# Altium footprint library SBCLib.PcbLib: 120 footprints (part 2 of 8)
Each footprint in its own frame and in the unit in brackets; x right, y up, seen from the top. Pads: shape width x height; smd on the part's side, far side on the other; paste and mask are expansions set on the pad; w line width, h text height; cw(c..) or ccw(c..) is an arc to the next point about the centre after c.
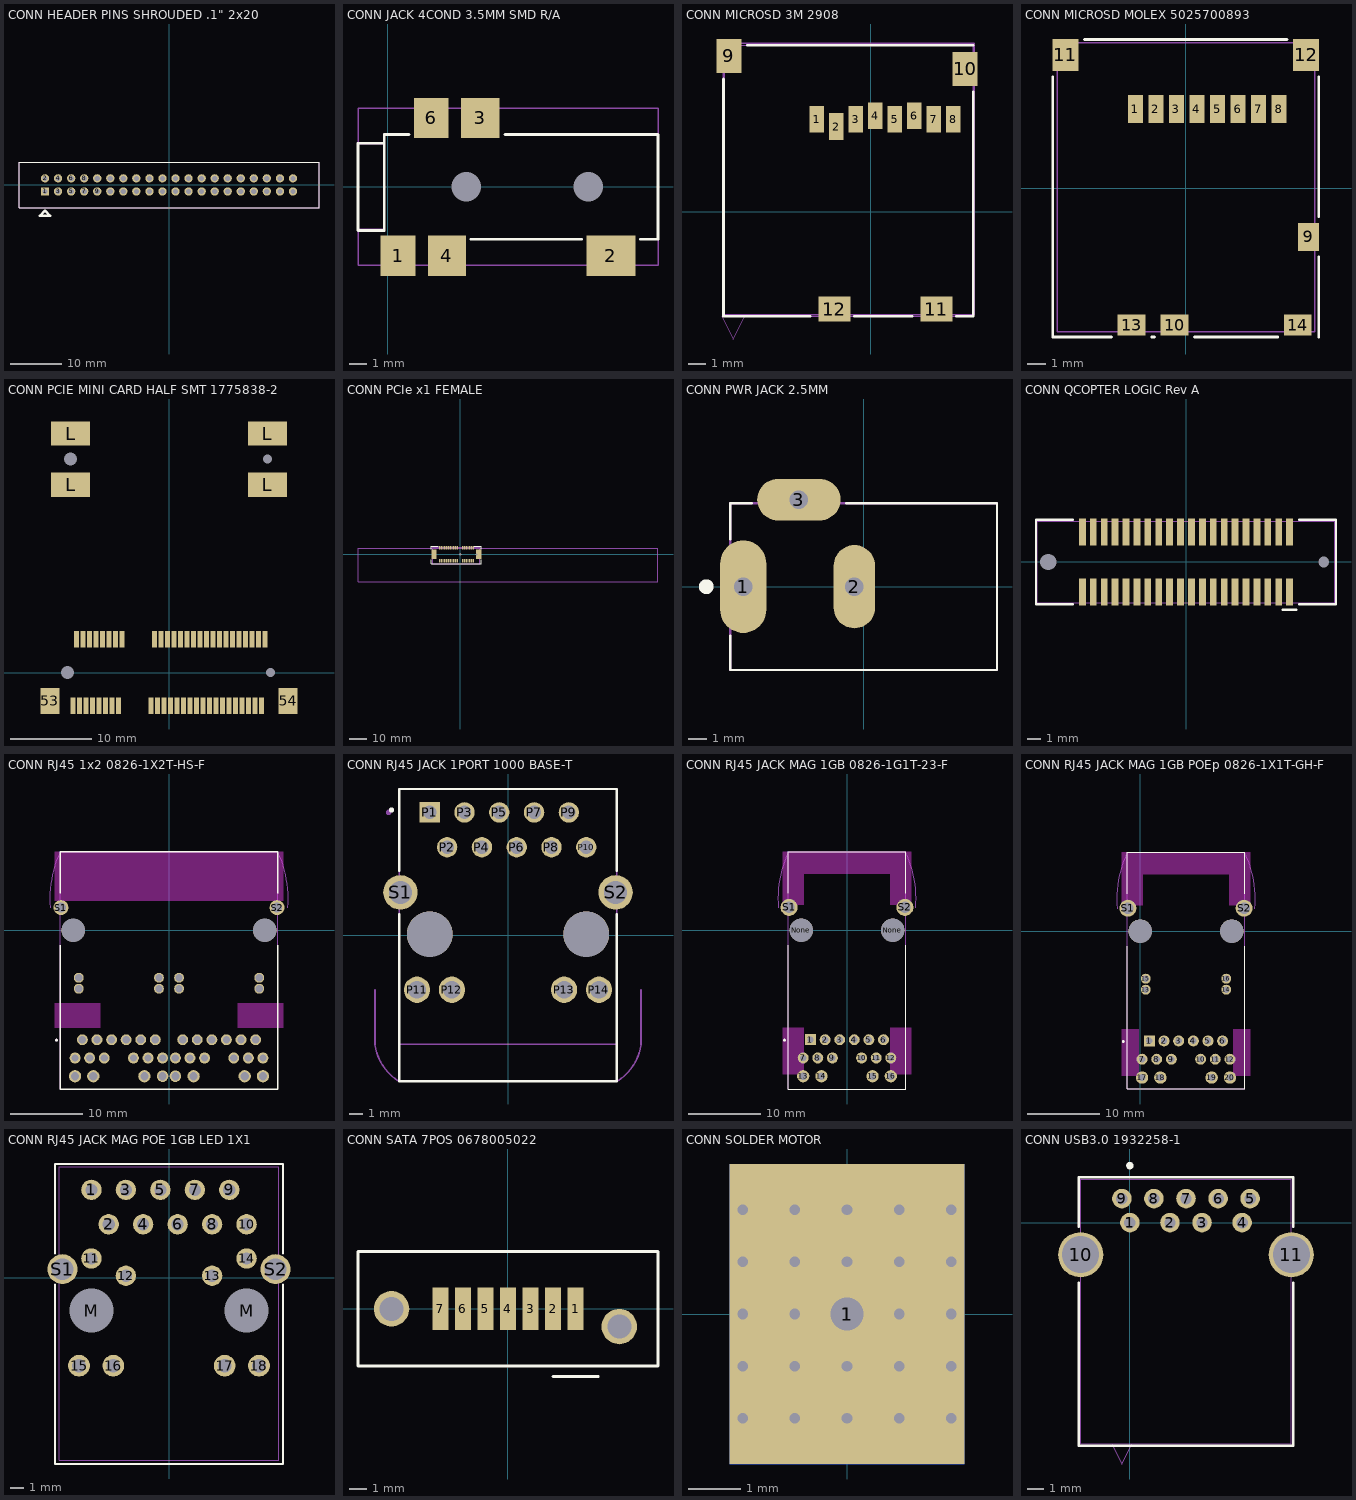
[diagram p1: the footprints below, top view; thin cyan lines are the x and y axes]

## CONN HEADER PINS SHROUDED .1" 2x20 [mm]
pads (40):
  rect 1.52x1.52 hole 1.02 paste+0: 1(-24.13,-1.27)
  round 1.62 hole 1.02 paste+0: 2(-24.13,1.27) 3(-21.59,-1.27) 4(-21.59,1.27) 5(-19.05,-1.27) 6(-19.05,1.27) 7(-16.51,-1.27) 8(-16.51,1.27) 9(-13.97,-1.27) 10(-13.97,1.27) 11(-11.43,-1.27) 12(-11.43,1.27) 13(-8.89,-1.27) 14(-8.89,1.27) 15(-6.35,-1.27) 16(-6.35,1.27) 17(-3.81,-1.27) 18(-3.81,1.27) 19(-1.27,-1.27) 20(-1.27,1.27) 21(1.27,-1.27) 22(1.27,1.27) 23(3.81,-1.27) 24(3.81,1.27) 25(6.35,-1.27) 26(6.35,1.27) 27(8.89,-1.27) 28(8.89,1.27) 29(11.43,-1.27) 30(11.43,1.27) 31(13.97,-1.27) 32(13.97,1.27) 33(16.51,-1.27) 34(16.51,1.27) 35(19.05,-1.27) 36(19.05,1.27) 37(21.59,-1.27) 38(21.59,1.27) 39(24.13,-1.27) 40(24.13,1.27)
Top Overlay:
  lines w0.178: -29.197,-4.407 -29.197,4.407 ; -29.197,-4.407 29.197,-4.407 ; -29.197,-4.407 29.197,-4.407 ; -29.197,-4.407 -29.197,4.407 ; -29.197,4.407 29.197,4.407 ; -29.197,4.407 29.197,4.407 ; 29.197,-4.407 29.197,4.407 ; 29.197,-4.407 29.197,4.407
  lines w0.5: -25.13,-6 -24.13,-5 -23.13,-6 -25.13,-6
Mechanical 3:
  lines w0.152: -29.197,-4.407 -29.197,4.407 ; -29.197,-4.407 29.197,-4.407 ; -29.197,-4.407 29.197,-4.407 ; -29.197,-4.407 -29.197,4.407 ; -29.197,4.407 29.197,4.407 ; -29.197,4.407 29.197,4.407 ; 29.197,-4.407 29.197,4.407 ; 29.197,-4.407 29.197,4.407
3D body "30340-6002.stp": height 8.89, standoff -3.17, extent -29.197,-4.407 29.198,4.407

## CONN JACK 4COND 3.5MM SMD R/A [mm]
pads (7):
  rect 2x2.3 smd paste+0: 1(0.6,-3.95) 6(2.5,3.95)
  rect 2.8x2.3 smd paste+0: 2(12.8,-3.95)
  rect 2.2x2.3 smd paste+0: 3(5.3,3.95) 4(3.4,-3.95)
  rect 1x1 hole 1.7 unplated paste+0: ""(4.5,0) ""(11.5,0)
Top Overlay:
  lines w0.152: -0.2,2.5 -1.7,2.5 -1.7,-2.5 -0.2,-2.5 -0.2,3 1.225,3 ; 4.775,-3 6,-3 11.125,-3 ; 6.725,3 15.5,3 15.5,-3 14.5,-3
Mechanical 3:
  lines w0.076: -1.7,-4.5 -1.7,4.5 15.5,4.5 15.5,-4.5 -1.7,-4.5 ; -1.7,-2.425 -1.7,2.475 -0.2,2.475 -0.2,-2.425 -1.7,-2.425
3D body "CUI_DEVICES_SJ-43515RS-SMT-TR.step": height 5.1, standoff -0.7, extent -1.7,-4.5 15.5,4.5

## CONN MICROSD 3M 2908 [mil]
pads (12):
  rect 32x59 smd: 1(-119.76,203.78) 2(-76.76,187.78) 3(-33.76,203.78) 4(9.24,211.78) 5(52.24,203.78) 6(95.24,211.78) 7(138.24,203.78) 8(181.24,203.78)
  rect 55x75 smd: 9(-313.5,343.5) 10(207.9,315.1)
  rect 71x55 smd: 11(144.5,-215) 12(-80.5,-215)
Top Overlay:
  lines w6: -325.5,292.9 -325.5,-231 -134.1,-231 ; -272.9,367 225.5,367 ; -36.9,-231 90.9,-231 ; 188.1,-231 225.5,-231 225.5,263.9
Mechanical 3:
  lines w3: -323.58,-227.21 -323.58,371.22 227.6,371.22 227.6,-227.21 -323.58,-227.21
Mechanical 13:
  lines w1: -328.94,-231 -303.94,-281 -278.94,-231 ; -325.5,-231 -325.5,367 225.5,367 225.5,-231 -325.5,-231
3D body "2908-05WB-MG--3DModel-STEP-56544.STEP": height 72.83, standoff 0, extent -323.58,-227.21 227.6,371.22

## CONN MICROSD MOLEX 5025700893 [mil]
pads (14):
  rect 32x59 smd paste+0 mask+0: 1(-106.3,167.27) 2(-62.99,167.27) 3(-19.68,167.27) 4(23.62,167.27) 5(66.93,167.27) 6(110.24,167.27) 7(153.54,167.27) 8(196.85,167.27)
  rect 45x59 smd: 9(258.86,-102.42)
  rect 59x45 smd: 10(-23.62,-288.44) 13(-114.17,-288.44) 14(236.22,-288.44)
  rect 55x67 smd: 11(-253.94,281.44) 12(253.94,281.44)
Top Overlay:
  lines w6: -280.5,234.84 -280.5,-314 -156.41,-314 ; -213.34,314 213.34,314 ; -71.94,-314 -65.86,-314 ; 18.62,-314 193.98,-314 ; 280.5,-314 280.5,-145.02 ; 280.5,-59.82 280.5,234.84
Mechanical 3:
  lines w3: -271.66,-303.15 -271.66,307.08 271.65,307.08 271.65,-303.15 -271.66,-303.15
3D body "5025700893.stp": height 70.43, standoff -0.43, extent -271.66,-303.15 271.65,307.08

## CONN PCIE MINI CARD HALF SMT 1775838-2 [mm]
pads (62):
  rect 0.61x2.007 smd paste+0 mask+0: 1(-11.8,-4.1) 2(-11.4,4.1) 3(-11,-4.1) 4(-10.6,4.1) 5(-10.2,-4.1) 6(-9.8,4.1) 7(-9.4,-4.1) 8(-9,4.1) 9(-8.6,-4.1) 10(-8.2,4.1) 11(-7.8,-4.1) 12(-7.4,4.1) 13(-7,-4.1) 14(-6.6,4.1) 15(-6.2,-4.1) 16(-5.8,4.1) 17(-2.2,-4.1) 18(-1.8,4.1) 19(-1.4,-4.1) 20(-1,4.1) 21(-0.6,-4.1) 22(-0.2,4.1) 23(0.2,-4.1) 24(0.6,4.1) 25(1,-4.1) 26(1.4,4.1) 27(1.8,-4.1) 28(2.2,4.1) 29(2.6,-4.1) 30(3,4.1) 31(3.4,-4.1) 32(3.8,4.1) 33(4.2,-4.1) 34(4.6,4.1) 35(5,-4.1) 36(5.4,4.1) 37(5.8,-4.1) 38(6.2,4.1) 39(6.6,-4.1) 40(7,4.1) 41(7.4,-4.1) 42(7.8,4.1) 43(8.2,-4.1) 44(8.6,4.1) 45(9,-4.1) 46(9.4,4.1) 47(9.8,-4.1) 48(10.2,4.1) 49(10.6,-4.1) 50(11,4.1) 51(11.4,-4.1) 52(11.8,4.1)
  rect 2.311x3.2 smd paste+0 mask+0: 53(-14.65,-3.5) 54(14.65,-3.5)
  round 0.5 hole 1.6 unplated: 55(-12.5,0)
  round 0.5 hole 1.118 unplated: 56(12.5,0)
  rect 4.8x3 smd paste+0: L(-12.1,23.1) L(-12.1,29.4) L(12.1,23.1) L(12.1,29.4)
  round 0.5 hole 1.6 unplated paste+0: L(-12.1,26.25)
  round 0.5 hole 1.1 unplated paste+0: L(12.1,26.25)
3D body "User Library-PCI Express Half-Mini Card.step": height 6.45, standoff 1.7, extent -15,0.075 15,26.875
3D body "c-1775838-2-g-3d.stp": height 5.58, standoff -0.67, extent -14.95,-4.58 14.95,4.5
3D body "480995701.stp": height 6.55, standoff -0.75, extent -14.225,21.94 14.225,31.4

## CONN PCIe x1 FEMALE [mm]
pads (40):
  rect 3x5.2 smd: 37(-14.65,0) 38(10.35,0)
  round 1 hole 1.2 unplated: 38(9.15,0) M1(0,0)
  rect 0.7x2 smd: A1(-11.65,3.6) A2(-10.65,3.6) A3(-9.65,3.6) A4(-8.65,3.6) A5(-7.65,3.6) A6(-6.65,3.6) A7(-5.65,3.6) A8(-4.65,3.6) A9(-3.65,3.6) A10(-2.65,3.6) A11(-1.65,3.6) A12(1.35,3.6) A13(2.35,3.6) A14(3.35,3.6) A15(4.35,3.6) A16(5.35,3.6) A17(6.35,3.6) A18(7.35,3.6) B1(-11.65,-3.6) B2(-10.65,-3.6) B3(-9.65,-3.6) B4(-8.65,-3.6) B5(-7.65,-3.6) B6(-6.65,-3.6) B7(-5.65,-3.6) B8(-4.65,-3.6) B9(-3.65,-3.6) B10(-2.65,-3.6) B11(-1.65,-3.6) B12(1.35,-3.6) B13(2.35,-3.6) B14(3.35,-3.6) B15(4.35,-3.6) B16(5.35,-3.6) B17(6.35,-3.6) B18(7.35,-3.6)
Top Overlay:
  lines w0.152: -16.15,-2.875 -16.15,-5.3 11.85,-5.3 11.85,-2.875 ; -16.15,2.875 -16.15,4.6 -12.25,4.6 ; 7.95,4.6 11.85,4.6 11.85,2.875
Mechanical 2:
  lines w0.254: -57.15,-15.34 110.49,-15.34 110.49,3.47 -57.15,3.47 -57.15,-15.34
  text "STD PCIe HALF LENGTH" at 21,-6 h1
Mechanical 3:
  lines w0.076: -15.25,-5.15 -15.25,4.05 10.95,4.05 10.95,-5.15 -15.25,-5.15
3D body "10061913-xx0.stp": height 11.07, standoff -0.93, extent -15.25,-5.15 10.95,4.05

## CONN PWR JACK 2.5MM [mm]
pads (3):
  oval 2.5x5 hole 1 square: 1(-6.5,0)
  oval 2.25x4.5 hole 1 square: 2(-0.5,0)
  oval 4.5x2.25 hole 1 square: 3(-3.5,4.7)
Top Overlay:
  circle w0.4: c-8.5,0 r0.2
  lines w0.127: -7.2,-2.65 -7.2,-4.5 7.2,-4.5 7.2,4.5 -0.95,4.5 ; -7.2,2.55 -7.2,4.5 -6.05,4.5
Mechanical 13:
  lines w0.127: -7.2,-4.5 7.2,-4.5 7.2,4.5 -7.2,4.5 -7.2,-4.5
3D body "CUI_DEVICES_PJ-202BH.step": height 11, standoff -3.5, extent -7.2,-4.5 7.2,4.9

## CONN QCOPTER LOGIC Rev A [mm]
pads (42):
  rect 0.5x2 smd: 1(7.6,-2.2) 2(7.6,2.2) 3(6.8,-2.2) 4(6.8,2.2) 5(6,-2.2) 6(6,2.2) 7(5.2,-2.2) 8(5.2,2.2) 9(4.4,-2.2) 10(4.4,2.2) 11(3.6,-2.2) 12(3.6,2.2) 13(2.8,-2.2) 14(2.8,2.2) 15(2,-2.2) 16(2,2.2) 17(1.2,-2.2) 18(1.2,2.2) 19(0.4,-2.2) 20(0.4,2.2) 21(-0.4,-2.2) 22(-0.4,2.2) 23(-1.2,-2.2) 24(-1.2,2.2) 25(-2,-2.2) 26(-2,2.2) 27(-2.8,-2.2) 28(-2.8,2.2) 29(-3.6,-2.2) 30(-3.6,2.2) 31(-4.4,-2.2) 32(-4.4,2.2) 33(-5.2,-2.2) 34(-5.2,2.2) 35(-6,-2.2) 36(-6,2.2) 37(-6.8,-2.2) 38(-6.8,2.2) 39(-7.6,-2.2) 40(-7.6,2.2)
  round 0.5 hole 1.2 unplated: M1(-10.1,0)
  round 0.5 hole 0.8 unplated: M1(10.1,0)
Top Overlay:
  lines w0.178: -8.3,-3.1 -11,-3.1 -11,3.1 -8.3,3.1 ; 7.1,-3.5 8.1,-3.5 ; 8.3,-3.1 11,-3.1 11,3.1 8.3,3.1
Mechanical 3:
  lines w0.076: -10.9,-3 10.9,-3 10.9,3 -10.9,3 -10.9,-3
3D body "10144518-041x0xxx.stp": height 4.65, standoff -0.7, extent -10.9,-3 10.9,3

## CONN RJ45 1x2 0826-1X2T-HS-F [mil]
pads (44):
  round 60 hole 40: 1_1(75,-600) 1_2(-475,-600) 2_1(155,-600) 2_2(-395,-600) 3_1(235,-600) 3_2(-315,-600) 4_1(315,-600) 4_2(-235,-600) 5_1(395,-600) 5_2(-155,-600) 6_1(475,-600) 6_2(-75,-600) 7_1(35,-700) 7_2(-515,-700) 8_1(115,-700) 8_2(-435,-700) 9_1(195,-700) 9_2(-355,-700) 10_1(355,-700) 10_2(-195,-700) 11_1(435,-700) 11_2(-115,-700) 12_1(515,-700) 12_2(-35,-700)
  round 54 hole 40: 13_1(55,-320) 13_2(-495,-320) 14_1(495,-320) 14_2(-55,-320) 15_1(55,-260) 15_2(-495,-260) 16_1(495,-260) 16_2(-55,-260)
  round 63 hole 45: 17_1(35,-800) 20_2(-35,-800)
  round 67.5 hole 45: 17_2(-515,-800) 18_1(135,-800) 18_2(-415,-800) 19_1(415,-800) 19_2(-135,-800) 20_1(515,-800)
  round 82.5 hole 55: S1(-592.5,125) S2(592.5,125)
  round 128 hole 128 unplated: ""(-525,0) ""(525,0)
Top Overlay:
  circle w7: c-617.52,-602.36 r3.94
  lines w7: -597,-81.81 -597,-870 597,-870 597,-81.81 ; -597,202.99 -597,430 597,430 597,202.99
Keep-Out Layer:
  region: 627,-534 376,-534 376,-399 627,-399
  region: -376,-534 -627,-534 -627,-399 -376,-399
  region: 626,-534 376,-534 376,-399 626,-399
  region: -376,-534 -626,-534 -626,-399 -376,-399
  region: 627,162 -627,162 -627,430 627,430
  region: 627,162 -627,162 -627,430 627,430
Mechanical 13:
  circle w7.87: c-617.52,-602.36 r3.94
  lines w5: -650.96,124.58 cw(c-54.86,176.73) -597.18,429.62 ; 597.18,429.62 cw(c54.86,176.73) 650.96,124.58 ; -597,-870 597,-870 597,430 -597,430 -597,-870
3D body "User Library-RJ45_1x2_8P_1000_mag.STEP": height 616.72, standoff -103.26, extent -635,-867 636.96,452.5

## CONN RJ45 JACK 1PORT 1000 BASE-T [mm] "6-2301994-2"
pads (18):
  rect 1.488x1.488 hole 0.98: P1(-5.715,8.965)
  round 1.488 hole 0.98: P2(-4.445,6.425) P3(-3.175,8.965) P4(-1.905,6.425) P5(-0.635,8.965) P6(0.635,6.425) P7(1.905,8.965) P8(3.175,6.425) P9(4.445,8.965) P10(5.715,6.425)
  round 1.92 hole 1.28: P11(-6.645,-3.985) P12(-4.095,-3.985) P13(4.095,-3.985) P14(6.645,-3.985)
  round 2.52 hole 1.68: S1(-7.855,3.125) S2(7.855,3.125)
  round 3.33 hole 3.33 unplated: ""(-5.715,0.075) ""(5.715,0.075)
Top Overlay:
  circle w0.178: c-8.509,9.144 r0.1
  lines w0.178: -7.95,1.535 -7.95,-10.675 7.95,-10.675 7.95,1.535 ; -7.95,4.705 -7.95,10.675 7.95,10.675 7.95,4.705
Mechanical 3:
  circle w0.2: c-8.715,8.965 r0.1
  lines w0.127: -9.725,-7.968 ccw(c-5.967,-7.44) -7.978,-10.658 ; -9.72,-8 -9.72,-4 ; -7.95,-7.975 7.95,-7.975 ; 7.978,-10.658 ccw(c5.967,-7.44) 9.725,-7.968 ; 9.72,-8 9.72,-4 ; -7.95,-10.675 7.95,-10.675 7.95,10.675 -7.95,10.675 -7.95,-10.675
3D body "c-6-2301994-2-a-3d.stp": height 15.62, standoff -3.68, extent -10,-10.675 10,10.675

## CONN RJ45 JACK MAG 1GB 0826-1G1T-23-F [mil] "0826-1G1T-23-F"
pads (20):
  rect 60x60 hole 35: 1(-200,-600)
  round 60 hole 35: 2(-120,-600) 3(-40,-600) 4(40,-600) 5(120,-600) 6(200,-600) 7(-240,-700) 8(-160,-700) 9(-80,-700) 10(80,-700) 11(160,-700) 12(240,-700)
  round 67.5 hole 40: 13(-240,-800) 14(-140,-800) 15(140,-800) 16(240,-800)
  round 128 hole 128 unplated: None(-250,0) None(250,0)
  round 93 hole 62: S1(-317.5,125) S2(317.5,125)
Top Overlay:
  circle w7.87: c-342.52,-602.36 r3.94
  lines w5: -321,-81.81 -321,-870 321,-870 321,-81.81 ; -321,202.99 -321,430 321,430 321,202.99
Keep-Out Layer:
  region: -351,140 -236,140 -236,310 236,310 236,140 351,140 351,430 -351,430
  region: -351,140 -236,140 -236,310 236,310 236,140 351,140 351,430 -351,430
  region: -351,-535 -236,-535 -236,-790 -351,-790
  region: 236,-535 351,-535 351,-790 236,-790
  region: -351,-535 -236,-535 -236,-790 -351,-790
  region: 236,-535 351,-535 351,-790 236,-790
  region: -351,140 -236,140 -236,310 236,310 236,140 351,140 351,430 -351,430
  region: -351,140 -236,140 -236,310 236,310 236,140 351,140 351,430 -351,430
  region: -351,-535 -236,-535 -236,-790 -351,-790
  region: 236,-535 351,-535 351,-790 236,-790
  region: -351,-535 -236,-535 -236,-790 -351,-790
  region: 236,-535 351,-535 351,-790 236,-790
  region: -351,140 -236,140 -236,310 236,310 236,140 351,140 351,430 -351,430
  region: -351,140 -236,140 -236,310 236,310 236,140 351,140 351,430 -351,430
  region: -351,-535 -236,-535 -236,-790 -351,-790
  region: 236,-535 351,-535 351,-790 236,-790
  region: -351,-535 -236,-535 -236,-790 -351,-790
  region: 236,-535 351,-535 351,-790 236,-790
Mechanical 3:
  circle w7.87: c-342.52,-602.36 r3.94
  circle w7.87: c-342.52,-602.36 r3.94
  lines w5: -321,-870 321,-870 ; -321,-870 321,-870 ; -321,-870 -321,430 ; -321,-870 -321,430 ; -321,430 321,430 ; -321,430 321,430 ; 321,-870 321,430 ; 321,-870 321,430 ; -375.8,122.69 cw(c220.64,174.87) -321.98,427.9 ccw(c220.64,174.87) -375.8,122.69 ; 321.98,427.9 cw(c-220.64,174.87) 375.8,122.69 ccw(c-220.64,174.87) 321.98,427.9
3D body "0826-1G1T-23-F--3DModel-STEP-56544.STEP": height 610.75, standoff -145, extent -375.5,-859.99 375.88,444.78

## CONN RJ45 JACK MAG 1GB POEp 0826-1X1T-GH-F [mil] "0826-1X1T-GH-F"
pads (24):
  rect 60x60 hole 35: 1(50,-600)
  round 60 hole 35: 2(130,-600) 3(210,-600) 4(290,-600) 5(370,-600) 6(450,-600) 7(10,-700) 8(90,-700) 9(170,-700) 10(330,-700) 11(410,-700) 12(490,-700)
  round 54 hole 35: 13(30,-320) 14(470,-320) 15(30,-260) 16(470,-260)
  round 67.5 hole 40: 17(10,-800) 18(110,-800) 19(390,-800) 20(490,-800)
  round 93 hole 62: S1(-67.5,125) S2(567.5,125)
  round 128 hole 128 unplated: ""(0,0) ""(500,0)
Top Overlay:
  circle w7.87: c-92.52,-602.36 r3.94
  lines w5: -71,-81.81 -71,-860 571,-860 571,-81.81 ; -71,202.99 -71,430 571,430 571,202.99
Keep-Out Layer:
  region: 601,-790 508,-790 508,-535 601,-535
  region: -8,-790 -101,-790 -101,-535 -8,-535
  region: 601,-790 508,-790 508,-535 601,-535
  region: -8,-790 -101,-790 -101,-535 -8,-535
  region: 601,140 486,140 486,310 14,310 14,140 -101,140 -101,430 601,430
  region: 601,140 486,140 486,310 14,310 14,140 -101,140 -101,430 601,430
Mechanical 3:
  circle w7.87: c-92.52,-602.36 r3.94
  lines w5: -125.8,122.69 cw(c470.64,174.87) -71.99,427.9 ; 571.99,427.9 cw(c29.36,174.87) 625.8,122.69 ; -71,-860 571,-860 571,430 -71,430 -71,-860
3D body "0826-1X1T-GH-F--3DModel-STEP-56544.STEP": height 590.69, standoff -145.28, extent -125.97,-860 625.97,456.34

## CONN RJ45 JACK MAG POE 1GB LED 1X1 [mm]
pads (22):
  round 1.5 hole 0.9: 1(-5.715,6.477) 2(-4.445,3.937) 3(-3.175,6.477) 4(-1.905,3.937) 5(-0.635,6.477) 6(0.635,3.937) 7(1.905,6.477) 8(3.175,3.937) 9(4.445,6.477) 10(5.715,3.937) 11(-5.715,1.422) 12(-3.175,0.152) 13(3.175,0.152) 14(5.715,1.422)
  round 1.6 hole 1.02: 15(-6.629,-6.477) 16(-4.102,-6.477) 17(4.102,-6.477) 18(6.629,-6.477)
  round 1.6 hole 3.25: M(-5.715,-2.413) M(5.715,-2.413)
  round 2.2 hole 1.6: S1(-7.849,0.635) S2(7.849,0.635)
Top Overlay:
  lines w0.152: -8.382,-0.508 -8.382,-7.112 -8.382,-13.716 8.382,-13.716 8.382,-7.112 8.382,-0.508 ; -8.382,1.778 -8.382,8.382 8.382,8.382 8.382,1.778
Mechanical 3:
  lines w0.076: -8.097,-13.423 8.097,-13.423 8.097,8.177 -8.097,8.177 -8.097,-13.423
3D body "c-5-2337992-8-a-3d.stp": height 13.75, standoff -3.45, extent -8.097,-13.423 8.097,8.177

## CONN SATA 7POS 0678005022 [mm]
pads (9):
  rect 0.9x2.4 smd paste+0: 1(3.81,0) 2(2.54,0) 3(1.27,0) 4(0,0) 5(-1.27,0) 6(-2.54,0) 7(-3.81,0)
  round 2 hole 1.35 paste+0: ""(-6.56,0) ""(6.27,-1)
Top Overlay:
  lines w0.152: 2.54,-3.81 5.08,-3.81 ; -8.45,-3.225 8.45,-3.225 8.45,3.225 -8.45,3.225 -8.45,-3.225
3D body "678005022.stp": height 8.4, standoff -3.45, extent -8.6,-3.995 8.3,2.455

## CONN SOLDER MOTOR [mm]
pads (2):
  rect 4.5x5.75 smd: 1(0,0)
  rect 4.5x5.75 smd far side: 1(0,0)
via 0,-1 diameter 0.457 hole 0.203
via 0,-2 diameter 0.457 hole 0.203
via 0,1 diameter 0.457 hole 0.203
via 0,2 diameter 0.457 hole 0.203
via -1,-2 diameter 0.457 hole 0.203
via -2,-2 diameter 0.457 hole 0.203
via 1,-2 diameter 0.457 hole 0.203
via 2,-2 diameter 0.457 hole 0.203
via -1,-1 diameter 0.457 hole 0.203
via -2,-1 diameter 0.457 hole 0.203
via 1,-1 diameter 0.457 hole 0.203
via 2,-1 diameter 0.457 hole 0.203
via -1,2 diameter 0.457 hole 0.203
via -2,2 diameter 0.457 hole 0.203
via 1,2 diameter 0.457 hole 0.203
via 2,2 diameter 0.457 hole 0.203
via -1,1 diameter 0.457 hole 0.203
via -2,1 diameter 0.457 hole 0.203
via 1,1 diameter 0.457 hole 0.203
via 2,1 diameter 0.457 hole 0.203
via 2,0 diameter 0.457 hole 0.203
via 1,0 diameter 0.457 hole 0.203
via -2,0 diameter 0.457 hole 0.203
via -1,0 diameter 0.457 hole 0.203
via 0,0 diameter 0.889 hole 0.635

## CONN USB3.0 1932258-1 [mil]
pads (11):
  round 48 hole 28 mask+0: 1(0,0) 2(98.43,0) 3(177.17,0) 4(275.59,0) 5(295.28,59.06) 6(216.54,59.06) 7(137.8,59.06) 8(59.06,59.06) 9(-19.68,59.06)
  round 111 hole 91: 10(-120.87,-78.74) 11(396.46,-78.74)
Top Overlay:
  circle w10: c0,140 r4
  lines w6: -125.2,-147.2 -125.2,-547.7 400.8,-547.7 400.8,-147.2 ; -125.2,-10.27 -125.2,111.3 400.8,111.3 400.8,-10.27
Mechanical 3:
  lines w1: -44.69,-542.7 -19.69,-592.7 5.31,-542.7 ; -120.2,-542.7 395.8,-542.7 395.8,106.3 -120.2,106.3 -120.2,-542.7
3D body "c-1932258-1-b-3d.stp": height 308.07, standoff -142.79, extent -179.03,-541.79 454.62,107.03